# Altium footprint library ARCOM_Chips.PcbLib: 185 footprints (part 5 of 12)
Each footprint in its own frame and in the unit in brackets; x right, y up, seen from the top. Pads: shape width x height; smd on the part's side, far side on the other; paste and mask are expansions set on the pad; w line width, h text height; cw(c..) or ccw(c..) is an arc to the next point about the centre after c.
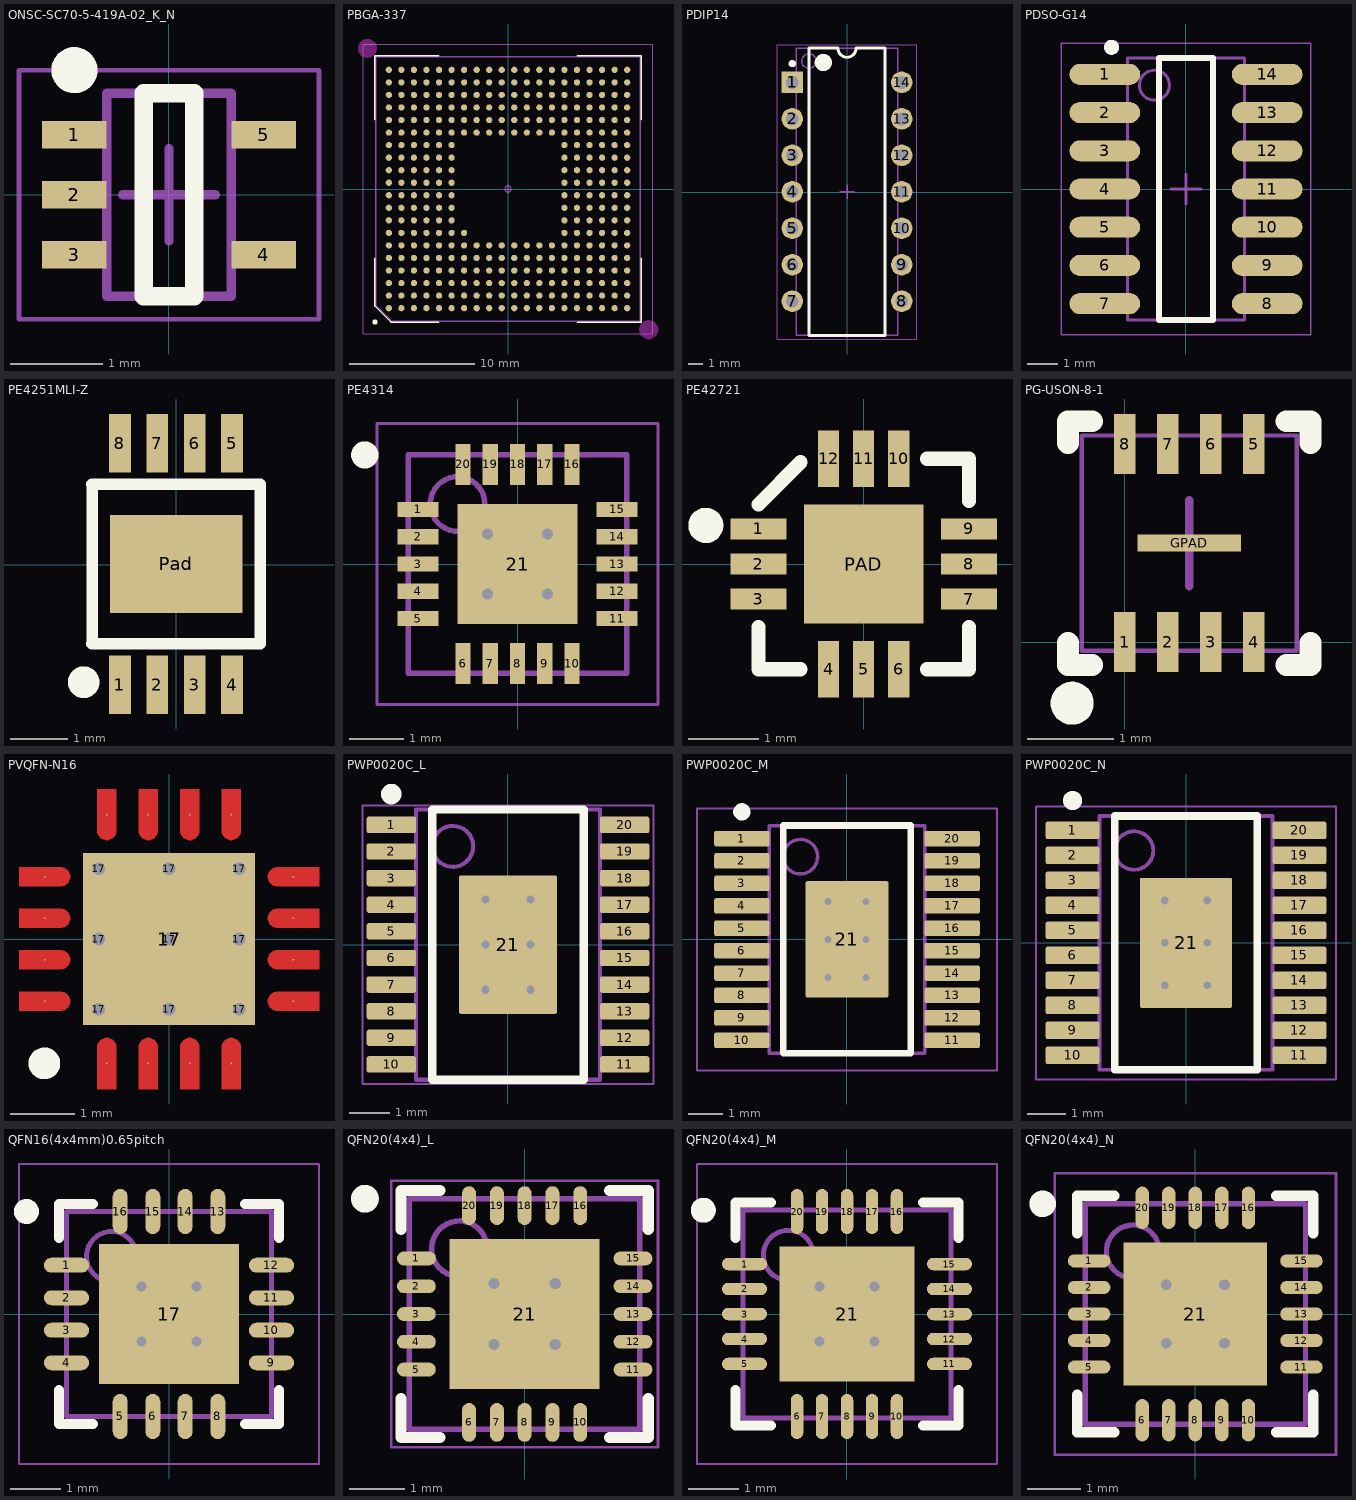
[diagram p4: the footprints below, top view; thin cyan lines are the x and y axes]

## ONSC-SC70-5-419A-02_K_N [mm] "SOT23, 5-Leads, Body 2.2x1.35mm, Pitch 0.65mm, IPC Medium Density"
height 1.1
pads (5):
  rect 0.7x0.3 smd: 1(-1.025,0.65) 2(-1.025,0) 3(-1.025,-0.65) 4(1.025,-0.65) 5(1.025,0.65)
Top Overlay:
  circle w0.25: c-1.025,1.35 r0.125
  lines w0.2: -0.275,-1.1 0.275,-1.1 0.275,1.1 -0.275,1.1 -0.275,-1.1
Mechanical 13:
  lines w0.1: -0.675,-1.1 -0.675,1.1 0.675,1.1 0.675,-1.1 -0.675,-1.1
M15 Top Assy:
  lines w0.05: -1.625,-1.35 -1.625,1.35 1.625,1.35 1.625,-1.35 -1.625,-1.35
  lines w0.1: -0.5,0 0.5,0 ; 0,-0.5 0,0.5
3D body: height 1.1, standoff 0, extent -0.675,-1.1 0.675,1.1

## PBGA-337 [mm]
height 2
pads (337):
  round 0.5 smd: A1(-9.5,-9.5) A2(-9.5,-8.5) A3(-9.5,-7.5) A4(-9.5,-6.5) A5(-9.5,-5.5) A6(-9.5,-4.5) A7(-9.5,-3.5) A8(-9.5,-2.5) A9(-9.5,-1.5) A10(-9.5,-0.5) A11(-9.5,0.5) A12(-9.5,1.5) A13(-9.5,2.5) A14(-9.5,3.5) A15(-9.5,4.5) A16(-9.5,5.5) A17(-9.5,6.5) A18(-9.5,7.5) A19(-9.5,8.5) A20(-9.5,9.5) B1(-8.5,-9.5) B2(-8.5,-8.5) B3(-8.5,-7.5) B4(-8.5,-6.5) B5(-8.5,-5.5) B6(-8.5,-4.5) B7(-8.5,-3.5) B8(-8.5,-2.5) B9(-8.5,-1.5) B10(-8.5,-0.5) B11(-8.5,0.5) B12(-8.5,1.5) B13(-8.5,2.5) B14(-8.5,3.5) B15(-8.5,4.5) B16(-8.5,5.5) B17(-8.5,6.5) B18(-8.5,7.5) B19(-8.5,8.5) B20(-8.5,9.5) C1(-7.5,-9.5) C2(-7.5,-8.5) C3(-7.5,-7.5) C4(-7.5,-6.5) C5(-7.5,-5.5) C6(-7.5,-4.5) C7(-7.5,-3.5) C8(-7.5,-2.5) C9(-7.5,-1.5) C10(-7.5,-0.5) C11(-7.5,0.5) C12(-7.5,1.5) C13(-7.5,2.5) C14(-7.5,3.5) C15(-7.5,4.5) C16(-7.5,5.5) C17(-7.5,6.5) C18(-7.5,7.5) C19(-7.5,8.5) C20(-7.5,9.5) D1(-6.5,-9.5) D2(-6.5,-8.5) D3(-6.5,-7.5) D4(-6.5,-6.5) D5(-6.5,-5.5) D6(-6.5,-4.5) D7(-6.5,-3.5) D8(-6.5,-2.5) D9(-6.5,-1.5) D10(-6.5,-0.5) D11(-6.5,0.5) D12(-6.5,1.5) D13(-6.5,2.5) D14(-6.5,3.5) D15(-6.5,4.5) D16(-6.5,5.5) D17(-6.5,6.5) D18(-6.5,7.5) D19(-6.5,8.5) D20(-6.5,9.5) E1(-5.5,-9.5) E2(-5.5,-8.5) E3(-5.5,-7.5) E4(-5.5,-6.5) E5(-5.5,-5.5) E6(-5.5,-4.5) E7(-5.5,-3.5) E8(-5.5,-2.5) E9(-5.5,-1.5) E10(-5.5,-0.5) E11(-5.5,0.5) E12(-5.5,1.5) E13(-5.5,2.5) E14(-5.5,3.5) E15(-5.5,4.5) E16(-5.5,5.5) E17(-5.5,6.5) E18(-5.5,7.5) E19(-5.5,8.5) E20(-5.5,9.5) F1(-4.5,-9.5) F2(-4.5,-8.5) F3(-4.5,-7.5) F4(-4.5,-6.5) F5(-4.5,-5.5) F6(-4.5,-4.5) F7(-4.5,-3.5) F8(-4.5,-2.5) F9(-4.5,-1.5) F10(-4.5,-0.5) F11(-4.5,0.5) F12(-4.5,1.5) F13(-4.5,2.5) F14(-4.5,3.5) F15(-4.5,4.5) F16(-4.5,5.5) F17(-4.5,6.5) F18(-4.5,7.5) F19(-4.5,8.5) F20(-4.5,9.5) G1(-3.5,-9.5) G2(-3.5,-8.5) G3(-3.5,-7.5) G4(-3.5,-6.5) G5(-3.5,-5.5) G6(-3.5,-4.5) G7(-3.5,-3.5) G15(-3.5,4.5) G16(-3.5,5.5) G17(-3.5,6.5) G18(-3.5,7.5) G19(-3.5,8.5) G20(-3.5,9.5) H1(-2.5,-9.5) H2(-2.5,-8.5) H3(-2.5,-7.5) H4(-2.5,-6.5) H5(-2.5,-5.5) H6(-2.5,-4.5) H15(-2.5,4.5) H16(-2.5,5.5) H17(-2.5,6.5) H18(-2.5,7.5) H19(-2.5,8.5) H20(-2.5,9.5) J1(-1.5,-9.5) J2(-1.5,-8.5) J3(-1.5,-7.5) J4(-1.5,-6.5) J5(-1.5,-5.5) J6(-1.5,-4.5) J15(-1.5,4.5) J16(-1.5,5.5) J17(-1.5,6.5) J18(-1.5,7.5) J19(-1.5,8.5) J20(-1.5,9.5) K1(-0.5,-9.5) K2(-0.5,-8.5) K3(-0.5,-7.5) K4(-0.5,-6.5) K5(-0.5,-5.5) K6(-0.5,-4.5) K15(-0.5,4.5) K16(-0.5,5.5) K17(-0.5,6.5) K18(-0.5,7.5) K19(-0.5,8.5) K20(-0.5,9.5) L1(0.5,-9.5) L2(0.5,-8.5) L3(0.5,-7.5) L4(0.5,-6.5) L5(0.5,-5.5) L6(0.5,-4.5) L15(0.5,4.5) L16(0.5,5.5) L17(0.5,6.5) L18(0.5,7.5) L19(0.5,8.5) L20(0.5,9.5) M1(1.5,-9.5) M2(1.5,-8.5) M3(1.5,-7.5) M4(1.5,-6.5) M5(1.5,-5.5) M6(1.5,-4.5) M15(1.5,4.5) M16(1.5,5.5) M17(1.5,6.5) M18(1.5,7.5) M19(1.5,8.5) M20(1.5,9.5) N1(2.5,-9.5) N2(2.5,-8.5) N3(2.5,-7.5) N4(2.5,-6.5) N5(2.5,-5.5) N6(2.5,-4.5) N15(2.5,4.5) N16(2.5,5.5) N17(2.5,6.5) N18(2.5,7.5) N19(2.5,8.5) N20(2.5,9.5) P1(3.5,-9.5) P2(3.5,-8.5) P3(3.5,-7.5) P4(3.5,-6.5) P5(3.5,-5.5) P6(3.5,-4.5) P15(3.5,4.5) P16(3.5,5.5) P17(3.5,6.5) P18(3.5,7.5) P19(3.5,8.5) P20(3.5,9.5) R1(4.5,-9.5) R2(4.5,-8.5) R3(4.5,-7.5) R4(4.5,-6.5) R5(4.5,-5.5) R6(4.5,-4.5) R7(4.5,-3.5) R8(4.5,-2.5) R9(4.5,-1.5) R10(4.5,-0.5) R11(4.5,0.5) R12(4.5,1.5) R13(4.5,2.5) R14(4.5,3.5) R15(4.5,4.5) R16(4.5,5.5) R17(4.5,6.5) R18(4.5,7.5) R19(4.5,8.5) R20(4.5,9.5) T1(5.5,-9.5) T2(5.5,-8.5) T3(5.5,-7.5) T4(5.5,-6.5) T5(5.5,-5.5) T6(5.5,-4.5) T7(5.5,-3.5) T8(5.5,-2.5) T9(5.5,-1.5) T10(5.5,-0.5) T11(5.5,0.5) T12(5.5,1.5) T13(5.5,2.5) T14(5.5,3.5) T15(5.5,4.5) T16(5.5,5.5) T17(5.5,6.5) T18(5.5,7.5) T19(5.5,8.5) T20(5.5,9.5) U1(6.5,-9.5) U2(6.5,-8.5) U3(6.5,-7.5) U4(6.5,-6.5) U5(6.5,-5.5) U6(6.5,-4.5) U7(6.5,-3.5) U8(6.5,-2.5) U9(6.5,-1.5) U10(6.5,-0.5) U11(6.5,0.5) U12(6.5,1.5) U13(6.5,2.5) U14(6.5,3.5) U15(6.5,4.5) U16(6.5,5.5) U17(6.5,6.5) U18(6.5,7.5) U19(6.5,8.5) U20(6.5,9.5) V1(7.5,-9.5) V2(7.5,-8.5) V3(7.5,-7.5) V4(7.5,-6.5) V5(7.5,-5.5) V6(7.5,-4.5) V7(7.5,-3.5) V8(7.5,-2.5) V9(7.5,-1.5) V10(7.5,-0.5) V11(7.5,0.5) V12(7.5,1.5) V13(7.5,2.5) V14(7.5,3.5) V15(7.5,4.5) V16(7.5,5.5) V17(7.5,6.5) V18(7.5,7.5) V19(7.5,8.5) V20(7.5,9.5) W1(8.5,-9.5) W2(8.5,-8.5) W3(8.5,-7.5) W4(8.5,-6.5) W5(8.5,-5.5) W6(8.5,-4.5) W7(8.5,-3.5) W8(8.5,-2.5) W9(8.5,-1.5) W10(8.5,-0.5) W11(8.5,0.5) W12(8.5,1.5) W13(8.5,2.5) W14(8.5,3.5) W15(8.5,4.5) W16(8.5,5.5) W17(8.5,6.5) W18(8.5,7.5) W19(8.5,8.5) W20(8.5,9.5) Y1(9.5,-9.5) Y2(9.5,-8.5) Y3(9.5,-7.5) Y4(9.5,-6.5) Y5(9.5,-5.5) Y6(9.5,-4.5) Y7(9.5,-3.5) Y8(9.5,-2.5) Y9(9.5,-1.5) Y10(9.5,-0.5) Y11(9.5,0.5) Y12(9.5,1.5) Y13(9.5,2.5) Y14(9.5,3.5) Y15(9.5,4.5) Y16(9.5,5.5) Y17(9.5,6.5) Y18(9.5,7.5) Y19(9.5,8.5) Y20(9.5,9.5)
Top Layer keep-out:
  region: 11.96,-11.21 11.96,-11.136 11.931,-10.991 11.875,-10.855 11.793,-10.732 11.688,-10.627 11.565,-10.545 11.429,-10.489 11.284,-10.46 11.21,-10.46 11.136,-10.46 10.991,-10.489 10.855,-10.545 10.732,-10.627 10.627,-10.732 10.545,-10.855 10.489,-10.991 10.46,-11.136 10.46,-11.21 10.46,-11.284 10.489,-11.429 10.545,-11.565 10.627,-11.688 10.732,-11.793 10.855,-11.875 10.991,-11.931 11.136,-11.96 11.21,-11.96 11.284,-11.96 11.429,-11.931 11.565,-11.875 11.688,-11.793 11.793,-11.688 11.875,-11.565 11.931,-11.429 11.96,-11.284
  region: -10.46,11.21 -10.46,11.284 -10.489,11.429 -10.545,11.565 -10.627,11.688 -10.732,11.793 -10.855,11.875 -10.991,11.931 -11.136,11.96 -11.21,11.96 -11.284,11.96 -11.429,11.931 -11.565,11.875 -11.688,11.793 -11.793,11.688 -11.875,11.565 -11.931,11.429 -11.96,11.284 -11.96,11.21 -11.96,11.136 -11.931,10.991 -11.875,10.855 -11.793,10.732 -11.688,10.627 -11.565,10.545 -11.429,10.489 -11.284,10.46 -11.21,10.46 -11.136,10.46 -10.991,10.489 -10.855,10.545 -10.732,10.627 -10.627,10.732 -10.545,10.855 -10.489,10.991 -10.46,11.136
Top Overlay:
  circle w0.2: c-10.61,-10.61 r0.1
  lines w0.12: -10.61,-5.53 -10.61,-9.34 -9.34,-10.61 -5.53,-10.61 ; -10.61,5.53 -10.61,10.61 -5.53,10.61 ; 5.53,-10.61 10.61,-10.61 10.61,-5.53 ; 5.53,10.61 10.61,10.61 10.61,5.53
M15 Top Assy:
  lines w0.12: -10.55,-9.28 -9.28,-10.55 10.55,-10.55 10.55,10.55 -10.55,10.55 -10.55,-9.28
Mechanical 20:
  circle w0.05: c0,0 r0.25
  lines w0.05: -0.35,0 0.35,0 ; 0,-0.35 0,0.35 ; -11.55,-11.55 -11.55,11.55 11.55,11.55 11.55,-11.55 -11.55,-11.55

## PDIP14 [mm]
pads (14):
  rect 1.5x1.5 hole 0.9: 1(-3.81,7.645)
  round 1.5 hole 0.9: 2(-3.81,5.105) 3(-3.81,2.565) 4(-3.81,0.025) 5(-3.81,-2.515) 6(-3.81,-5.055) 7(-3.81,-7.595) 8(3.81,-7.595) 9(3.81,-5.055) 10(3.81,-2.515) 11(3.81,0.025) 12(3.81,2.565) 13(3.81,5.105) 14(3.81,7.645)
Top Overlay:
  circle w0.25: c-3.81,8.945 r0.125
  circle w0.6: c-1.65,9.025 r0.3
  lines w0.2: -2.65,-9.975 -2.65,10.025 -0.635,10.025 ccw(c0,10.025) 0.635,10.025 2.65,10.025 2.65,-9.975 -2.65,-9.975
Mechanical 13:
  circle w0.1: c-2.65,9.125 r0.5
  lines w0.1: -3.55,-9.975 -3.55,10.025 3.55,10.025 3.55,-9.975 -3.55,-9.975
M15 Top Assy:
  lines w0.05: -4.85,-10.225 -4.85,10.275 4.85,10.275 4.85,-10.225 -4.85,-10.225
  lines w0.1: -0.5,0.025 0.5,0.025 ; 0,-0.475 0,0.525
3D body: height 5.1, standoff 0.51, extent -3.55,-9.975 3.55,10.025

## PDSO-G14 [mm]
pads (14):
  oval 2.35x0.7 smd: 1(-2.7,3.81) 2(-2.7,2.54) 3(-2.7,1.27) 4(-2.7,0) 5(-2.7,-1.27) 6(-2.7,-2.54) 7(-2.7,-3.81) 8(2.7,-3.81) 9(2.7,-2.54) 10(2.7,-1.27) 11(2.7,0) 12(2.7,1.27) 13(2.7,2.54) 14(2.7,3.81)
Top Overlay:
  circle w0.25: c-2.475,4.71 r0.125
  lines w0.2: -0.9,-4.35 0.9,-4.35 0.9,4.35 -0.9,4.35 -0.9,-4.35
Mechanical 13:
  circle w0.1: c-1.05,3.45 r0.5
  lines w0.1: -1.95,-4.35 1.95,-4.35 1.95,4.35 -1.95,4.35 -1.95,-4.35
M15 Top Assy:
  lines w0.05: -4.15,-4.85 4.15,-4.85 4.15,4.85 -4.15,4.85 -4.15,-4.85
  lines w0.1: -0.5,0 0.5,0 ; 0,-0.5 0,0.5
3D body: height 1.75, standoff 0.1, extent -1.95,-4.35 1.95,4.35

## PE4251MLI-Z [mil]
pads (9):
  rect 15x40 smd: 1(-38.7,-82.02) 2(-13.1,-82.02) 3(12.5,-82.02) 4(38.1,-82.02) 5(38.1,82.98) 6(12.5,82.98) 7(-13.1,82.98) 8(-38.7,82.98)
  rect 90.55x66.93 smd: Pad(-0.2,0.5)
Top Overlay:
  circle w11.81: c-63.36,-80.28 r4.92
  lines w7.87: -57.7,-53.87 57.3,-53.87 57.28,54.83 -57.7,54.83 -57.68,-53.83

## PE4314 [mm] "QFN, 20-Leads, Body 4,00x4,00mm, Pitch 0,50mm, Thermal Pad 2,20x2,20mm, IPC Medium Density"
height 0.9
pads (21):
  rect 0.75x0.28 smd mask+0.057: 1(-1.825,1) 2(-1.825,0.5) 3(-1.825,0) 4(-1.825,-0.5) 5(-1.825,-1) 11(1.825,-1) 12(1.825,-0.5) 13(1.825,0) 14(1.825,0.5) 15(1.825,1)
  rect 0.28x0.75 smd mask+0.057: 6(-1,-1.825) 7(-0.5,-1.825) 8(0,-1.825) 9(0.5,-1.825) 10(1,-1.825) 16(1,1.825) 17(0.5,1.825) 18(0,1.825) 19(-0.5,1.825) 20(-1,1.825)
  rect 2.2x2.2 smd mask+0.057: 21(0,0)
via -0.55,0.55 diameter 0.5 hole 0.2
via 0.55,0.55 diameter 0.5 hole 0.2
via -0.55,-0.55 diameter 0.5 hole 0.2
via 0.55,-0.55 diameter 0.5 hole 0.2
Top Overlay:
  circle w0.25: c-2.8,2 r0.125
Mechanical 13:
  circle w0.1: c-1.1,1.1 r0.5
  lines w0.1: -2,-2 -2,2 2,2 2,-2 -2,-2
M15 Top Assy:
  lines w0.05: -2.575,-2.575 -2.575,2.575 2.575,2.575 2.575,-2.575 -2.575,-2.575
  lines w0.1: -0.5,0 0.5,0 ; 0,-0.5 0,0.5
3D body "PE4314.step": height 0.9, standoff 0, extent -2.05,-2.05 2.05,2.05

## PE42721 [mm]
pads (13):
  rect 0.8x0.3 smd: 1(-1.5,0.5) 2(-1.5,0) 3(-1.5,-0.5) 7(1.5,-0.5) 8(1.5,0) 9(1.5,0.5)
  rect 0.3x0.8 smd: 4(-0.5,-1.5) 5(0,-1.5) 6(0.5,-1.5) 10(0.5,1.5) 11(0,1.5) 12(-0.5,1.5)
  rect 1.7x1.7 smd: PAD(0,0)
Top Overlay:
  circle w0.25: c-2.25,0.55 r0.125
  lines w0.2: -1.5,-0.9 -1.5,-1.5 -0.9,-1.5 ; -1.5,0.85 -0.9,1.45 ; 0.9,-1.5 1.5,-1.5 1.5,-0.9 ; 0.9,1.5 1.5,1.5 1.5,0.9
3D body "User Library-qfn12p300x300ll055ls050h075.SLDPRT": height 0.75, standoff 0, extent -1.499,-1.499 1.501,1.501

## PG-USON-8-1 [mm]
pads (9):
  rect 0.25x0.7 smd: 1(0,0) 2(0.5,0) 3(1,0) 4(1.5,0) 5(1.5,2.3) 6(1,2.3) 7(0.5,2.3) 8(0,2.3)
  rect 1.2x0.2 smd: GPAD(0.75,1.15)
Top Overlay:
  circle w0.25: c-0.61,-0.711 r0.125
  lines w0.254: -0.66,-0.011 -0.66,-0.265 -0.381,-0.265 ; -0.66,2.311 -0.66,2.565 -0.381,2.565 ; 1.881,-0.265 2.16,-0.265 2.16,-0.011 ; 1.881,2.565 2.16,2.565 2.16,2.311
M15 Top Assy:
  lines w0.05: -0.5,-0.1 2,-0.1 2,2.4 -0.5,2.4 -0.5,-0.1
  lines w0.1: 0.25,1.15 1.25,1.15 ; 0.75,0.65 0.75,1.65
3D body: height 0.6, standoff 0, extent -0.5,-0.1 2.007,2.4

## PVQFN-N16 [mm]
pads (26):
  round 0.025 smd: 1(-0.975,-1.95) 2(-0.325,-1.95) 3(0.325,-1.95) 4(0.975,-1.95) 5(1.95,-0.975) 6(1.95,-0.325) 7(1.95,0.325) 8(1.95,0.975) 9(0.975,1.95) 10(0.325,1.95) 11(-0.325,1.95) 12(-0.975,1.95) 13(-1.95,0.975) 14(-1.95,0.325) 15(-1.95,-0.325) 16(-1.95,-0.975)
  round 0.254 hole 0.2: 17(-1.1,-1.1) 17(-1.1,0) 17(-1.1,1.1) 17(0,-1.1) 17(0,0) 17(0,1.1) 17(1.1,-1.1) 17(1.1,0) 17(1.1,1.1)
  rect 2.7x2.7 smd: 17(0,0)
Top Layer:
  region: -0.175,-2.35 -0.175,-1.7 -0.175,-1.68 -0.185,-1.642 -0.205,-1.608 -0.233,-1.58 -0.267,-1.56 -0.305,-1.55 -0.345,-1.55 -0.383,-1.56 -0.417,-1.58 -0.445,-1.608 -0.465,-1.642 -0.475,-1.68 -0.475,-1.7 -0.475,-2.35
  region: 0.475,-2.35 0.475,-1.7 0.475,-1.68 0.465,-1.642 0.445,-1.608 0.417,-1.58 0.383,-1.56 0.345,-1.55 0.305,-1.55 0.267,-1.56 0.233,-1.58 0.205,-1.608 0.185,-1.642 0.175,-1.68 0.175,-1.7 0.175,-2.35
  region: 1.125,-2.35 1.125,-1.7 1.125,-1.68 1.115,-1.642 1.095,-1.608 1.067,-1.58 1.033,-1.56 0.995,-1.55 0.955,-1.55 0.917,-1.56 0.883,-1.58 0.855,-1.608 0.835,-1.642 0.825,-1.68 0.825,-1.7 0.825,-2.35
  region: -1.125,-2.35 -1.125,-1.7 -1.125,-1.68 -1.115,-1.642 -1.095,-1.608 -1.067,-1.58 -1.033,-1.56 -0.995,-1.55 -0.955,-1.55 -0.917,-1.56 -0.883,-1.58 -0.855,-1.608 -0.835,-1.642 -0.825,-1.68 -0.825,-1.7 -0.825,-2.35
  region: 0.175,2.35 0.175,1.7 0.175,1.68 0.185,1.642 0.205,1.608 0.233,1.58 0.267,1.56 0.305,1.55 0.345,1.55 0.383,1.56 0.417,1.58 0.445,1.608 0.465,1.642 0.475,1.68 0.475,1.7 0.475,2.35
  region: -0.475,2.35 -0.475,1.7 -0.475,1.68 -0.465,1.642 -0.445,1.608 -0.417,1.58 -0.383,1.56 -0.345,1.55 -0.305,1.55 -0.267,1.56 -0.233,1.58 -0.205,1.608 -0.185,1.642 -0.175,1.68 -0.175,1.7 -0.175,2.35
  region: -1.125,2.35 -1.125,1.7 -1.125,1.68 -1.115,1.642 -1.095,1.608 -1.067,1.58 -1.033,1.56 -0.995,1.55 -0.955,1.55 -0.917,1.56 -0.883,1.58 -0.855,1.608 -0.835,1.642 -0.825,1.68 -0.825,1.7 -0.825,2.35
  region: 1.125,2.35 1.125,1.7 1.125,1.68 1.115,1.642 1.095,1.608 1.067,1.58 1.033,1.56 0.995,1.55 0.955,1.55 0.917,1.56 0.883,1.58 0.855,1.608 0.835,1.642 0.825,1.68 0.825,1.7 0.825,2.35
  region: 2.35,-0.175 1.7,-0.175 1.68,-0.175 1.642,-0.185 1.608,-0.205 1.58,-0.233 1.56,-0.267 1.55,-0.305 1.55,-0.345 1.56,-0.383 1.58,-0.417 1.608,-0.445 1.642,-0.465 1.68,-0.475 1.7,-0.475 2.35,-0.475
  region: 2.35,0.475 1.7,0.475 1.68,0.475 1.642,0.465 1.608,0.445 1.58,0.417 1.56,0.383 1.55,0.345 1.55,0.305 1.56,0.267 1.58,0.233 1.608,0.205 1.642,0.185 1.68,0.175 1.7,0.175 2.35,0.175
  region: 2.35,1.125 1.7,1.125 1.68,1.125 1.642,1.115 1.608,1.095 1.58,1.067 1.56,1.033 1.55,0.995 1.55,0.955 1.56,0.917 1.58,0.883 1.608,0.855 1.642,0.835 1.68,0.825 1.7,0.825 2.35,0.825
  region: 2.35,-1.125 1.7,-1.125 1.68,-1.125 1.642,-1.115 1.608,-1.095 1.58,-1.067 1.56,-1.033 1.55,-0.995 1.55,-0.955 1.56,-0.917 1.58,-0.883 1.608,-0.855 1.642,-0.835 1.68,-0.825 1.7,-0.825 2.35,-0.825
  region: -2.35,0.175 -1.7,0.175 -1.68,0.175 -1.642,0.185 -1.608,0.205 -1.58,0.233 -1.56,0.267 -1.55,0.305 -1.55,0.345 -1.56,0.383 -1.58,0.417 -1.608,0.445 -1.642,0.465 -1.68,0.475 -1.7,0.475 -2.35,0.475
  region: -2.35,-0.475 -1.7,-0.475 -1.68,-0.475 -1.642,-0.465 -1.608,-0.445 -1.58,-0.417 -1.56,-0.383 -1.55,-0.345 -1.55,-0.305 -1.56,-0.267 -1.58,-0.233 -1.608,-0.205 -1.642,-0.185 -1.68,-0.175 -1.7,-0.175 -2.35,-0.175
  region: -2.35,-1.125 -1.7,-1.125 -1.68,-1.125 -1.642,-1.115 -1.608,-1.095 -1.58,-1.067 -1.56,-1.033 -1.55,-0.995 -1.55,-0.955 -1.56,-0.917 -1.58,-0.883 -1.608,-0.855 -1.642,-0.835 -1.68,-0.825 -1.7,-0.825 -2.35,-0.825
  region: -2.35,1.125 -1.7,1.125 -1.68,1.125 -1.642,1.115 -1.608,1.095 -1.58,1.067 -1.56,1.033 -1.55,0.995 -1.55,0.955 -1.56,0.917 -1.58,0.883 -1.608,0.855 -1.642,0.835 -1.68,0.825 -1.7,0.825 -2.35,0.825
Top Overlay:
  circle w0.254: c-1.953,-1.948 r0.122

## PWP0020C_L [mm] "SOP, 20-Leads, Body 6.6x4.5mm, Pitch 0.65mm, Thermal Pad 3.38x2.4mm, IPC High Density"
height 1.2
pads (21):
  rrect25% 1.2x0.4 smd: 1(-2.85,2.925) 2(-2.85,2.275) 3(-2.85,1.625) 4(-2.85,0.975) 5(-2.85,0.325) 6(-2.85,-0.325) 7(-2.85,-0.975) 8(-2.85,-1.625) 9(-2.85,-2.275) 10(-2.85,-2.925) 11(2.85,-2.925) 12(2.85,-2.275) 13(2.85,-1.625) 14(2.85,-0.975) 15(2.85,-0.325) 16(2.85,0.325) 17(2.85,0.975) 18(2.85,1.625) 19(2.85,2.275) 20(2.85,2.925)
  rrect4% 2.4x3.38 smd: 21(0,0)
via 0.55,-1.1 diameter 0.5 hole 0.2
via -0.55,-1.1 diameter 0.5 hole 0.2
via 0.55,0 diameter 0.5 hole 0.2
via -0.55,0 diameter 0.5 hole 0.2
via 0.55,1.1 diameter 0.5 hole 0.2
via -0.55,1.1 diameter 0.5 hole 0.2
Top Overlay:
  circle w0.25: c-2.85,3.675 r0.125
  lines w0.2: -1.85,-3.3 1.85,-3.3 1.85,3.3 -1.85,3.3 -1.85,-3.3
Mechanical 1:
  text ".Designator" at -1.524,-0.508 h1.02
Mechanical 13:
  circle w0.1: c-1.35,2.4 r0.5
  lines w0.1: -2.25,-3.3 2.25,-3.3 2.25,3.3 -2.25,3.3 -2.25,-3.3
M15 Top Assy:
  lines w0.05: -3.55,-3.4 3.55,-3.4 3.55,3.4 -3.55,3.4 -3.55,-3.4
  lines w0.1: -0.5,0 0.5,0 ; 0,-0.5 0,0.5
3D body "MXA20A_ASM.stp": height 1, standoff 0, extent -3.21,-3.25 3.21,3.25

## PWP0020C_M [mm] "SOP, 20-Leads, Body 6.6x4.5mm, Pitch 0.65mm, Thermal Pad 3.38x2.4mm, IPC Low Density"
height 1.2
pads (21):
  rrect22% 1.6x0.45 smd: 1(-3.05,2.925) 2(-3.05,2.275) 3(-3.05,1.625) 4(-3.05,0.975) 5(-3.05,0.325) 6(-3.05,-0.325) 7(-3.05,-0.975) 8(-3.05,-1.625) 9(-3.05,-2.275) 10(-3.05,-2.925) 11(3.05,-2.925) 12(3.05,-2.275) 13(3.05,-1.625) 14(3.05,-0.975) 15(3.05,-0.325) 16(3.05,0.325) 17(3.05,0.975) 18(3.05,1.625) 19(3.05,2.275) 20(3.05,2.925)
  rrect4% 2.4x3.38 smd: 21(0,0)
via -0.55,1.1 diameter 0.5 hole 0.2
via 0.55,1.1 diameter 0.5 hole 0.2
via -0.55,0 diameter 0.5 hole 0.2
via 0.55,0 diameter 0.5 hole 0.2
via -0.55,-1.1 diameter 0.5 hole 0.2
via 0.55,-1.1 diameter 0.5 hole 0.2
Top Overlay:
  circle w0.25: c-3.05,3.7 r0.125
  lines w0.2: -1.85,-3.3 -1.85,3.3 1.85,3.3 1.85,-3.3 -1.85,-3.3
Mechanical 1:
  text ".Designator" at -1.524,-0.508 h1.02
Mechanical 13:
  circle w0.1: c-1.35,2.4 r0.5
  lines w0.1: -2.25,-3.3 -2.25,3.3 2.25,3.3 2.25,-3.3 -2.25,-3.3
M15 Top Assy:
  lines w0.05: -4.35,-3.8 -4.35,3.8 4.35,3.8 4.35,-3.8 -4.35,-3.8
  lines w0.1: -0.5,0 0.5,0 ; 0,-0.5 0,0.5
3D body "MXA20A_ASM.stp": height 1, standoff 0, extent -3.21,-3.25 3.21,3.25

## PWP0020C_N [mm] "SOP, 20-Leads, Body 6.6x4.5mm, Pitch 0.65mm, Thermal Pad 3.38x2.4mm, IPC Medium Density"
height 1.2
pads (21):
  rrect22% 1.4x0.45 smd: 1(-2.95,2.925) 2(-2.95,2.275) 3(-2.95,1.625) 4(-2.95,0.975) 5(-2.95,0.325) 6(-2.95,-0.325) 7(-2.95,-0.975) 8(-2.95,-1.625) 9(-2.95,-2.275) 10(-2.95,-2.925) 11(2.95,-2.925) 12(2.95,-2.275) 13(2.95,-1.625) 14(2.95,-0.975) 15(2.95,-0.325) 16(2.95,0.325) 17(2.95,0.975) 18(2.95,1.625) 19(2.95,2.275) 20(2.95,2.925)
  rrect4% 2.4x3.38 smd: 21(0,0)
via -0.55,1.1 diameter 0.5 hole 0.2
via 0.55,1.1 diameter 0.5 hole 0.2
via -0.55,0 diameter 0.5 hole 0.2
via 0.55,0 diameter 0.5 hole 0.2
via -0.55,-1.1 diameter 0.5 hole 0.2
via 0.55,-1.1 diameter 0.5 hole 0.2
Top Overlay:
  circle w0.25: c-2.95,3.7 r0.125
  lines w0.2: -1.85,-3.3 -1.85,3.3 1.85,3.3 1.85,-3.3 -1.85,-3.3
Mechanical 1:
  text ".Designator" at -1.524,-0.508 h1.02
Mechanical 13:
  circle w0.1: c-1.35,2.4 r0.5
  lines w0.1: -2.25,-3.3 -2.25,3.3 2.25,3.3 2.25,-3.3 -2.25,-3.3
M15 Top Assy:
  lines w0.05: -3.9,-3.55 -3.9,3.55 3.9,3.55 3.9,-3.55 -3.9,-3.55
  lines w0.1: -0.5,0 0.5,0 ; 0,-0.5 0,0.5
3D body "MXA20A_ASM.stp": height 1, standoff 0, extent -3.21,-3.25 3.21,3.25

## QFN16(4x4mm)0.65pitch [mm]
pads (17):
  oval 0.9x0.3 smd: 1(-2.05,0.975) 2(-2.05,0.325) 3(-2.05,-0.325) 4(-2.05,-0.975) 9(2.05,-0.975) 10(2.05,-0.325) 11(2.05,0.325) 12(2.05,0.975)
  oval 0.3x0.9 smd: 5(-0.975,-2.05) 6(-0.325,-2.05) 7(0.325,-2.05) 8(0.975,-2.05) 13(0.975,2.05) 14(0.325,2.05) 15(-0.325,2.05) 16(-0.975,2.05)
  rect 2.8x2.8 smd: 17(0,0)
via -0.55,0.55 diameter 0.5 hole 0.2
via 0.55,0.55 diameter 0.5 hole 0.2
via -0.55,-0.55 diameter 0.5 hole 0.2
via 0.55,-0.55 diameter 0.5 hole 0.2
Top Overlay:
  circle w0.25: c-2.85,2.05 r0.125
  lines w0.2: -2.2,-1.525 -2.2,-2.2 -1.525,-2.2 ; -2.2,1.525 -2.2,2.2 -1.525,2.2 ; 1.525,-2.2 2.2,-2.2 2.2,-1.525 ; 1.525,2.2 2.2,2.2 2.2,1.525
Mechanical 13:
  circle w0.1: c-1.15,1.15 r0.5
  lines w0.1: -2.05,-2.05 -2.05,2.05 2.05,2.05 2.05,-2.05 -2.05,-2.05
M15 Top Assy:
  lines w0.05: -3,-3 -3,3 3,3 3,-3 -3,-3
  lines w0.1: -0.5,0 0.5,0 ; 0,-0.5 0,0.5
3D body: height 1, standoff 0, extent -2.05,-2.05 2.05,2.05

## QFN20(4x4)_L [mm] "QFN, 20-Leads, Body 4x4mm, Pitch 0.5mm, Thermal Pad 2.7x2.7mm, IPC High Density"
height 1
pads (21):
  oval 0.7x0.25 smd: 1(-1.95,1) 2(-1.95,0.5) 3(-1.95,0) 4(-1.95,-0.5) 5(-1.95,-1) 11(1.95,-1) 12(1.95,-0.5) 13(1.95,0) 14(1.95,0.5) 15(1.95,1)
  oval 0.25x0.7 smd: 6(-1,-1.95) 7(-0.5,-1.95) 8(0,-1.95) 9(0.5,-1.95) 10(1,-1.95) 16(1,1.95) 17(0.5,1.95) 18(0,1.95) 19(-0.5,1.95) 20(-1,1.95)
  rect 2.7x2.7 smd: 21(0,0)
via 0.55,-0.55 diameter 0.5 hole 0.2
via -0.55,-0.55 diameter 0.5 hole 0.2
via 0.55,0.55 diameter 0.5 hole 0.2
via -0.55,0.55 diameter 0.5 hole 0.2
Top Overlay:
  circle w0.25: c-2.875,2.075 r0.125
  lines w0.2: -2.225,-1.525 -2.225,-2.225 -1.525,-2.225 ; -2.225,1.525 -2.225,2.225 -1.525,2.225 ; 1.525,-2.225 2.225,-2.225 2.225,-1.525 ; 1.525,2.225 2.225,2.225 2.225,1.525
Mechanical 13:
  circle w0.1: c-1.175,1.175 r0.5
  lines w0.1: -2.075,-2.075 2.075,-2.075 2.075,2.075 -2.075,2.075 -2.075,-2.075
M15 Top Assy:
  lines w0.05: -2.4,-2.4 2.4,-2.4 2.4,2.4 -2.4,2.4 -2.4,-2.4
  lines w0.1: -0.5,0 0.5,0 ; 0,-0.5 0,0.5
3D body: height 1, standoff 0, extent -2.075,-2.075 2.075,2.075

## QFN20(4x4)_M [mm] "QFN, 20-Leads, Body 4x4mm, Pitch 0.5mm, Thermal Pad 2.7x2.7mm, IPC Low Density"
height 1
pads (21):
  oval 0.9x0.25 smd: 1(-2.05,1) 2(-2.05,0.5) 3(-2.05,0) 4(-2.05,-0.5) 5(-2.05,-1) 11(2.05,-1) 12(2.05,-0.5) 13(2.05,0) 14(2.05,0.5) 15(2.05,1)
  oval 0.25x0.9 smd: 6(-1,-2.05) 7(-0.5,-2.05) 8(0,-2.05) 9(0.5,-2.05) 10(1,-2.05) 16(1,2.05) 17(0.5,2.05) 18(0,2.05) 19(-0.5,2.05) 20(-1,2.05)
  rect 2.7x2.7 smd: 21(0,0)
via 0.55,-0.55 diameter 0.5 hole 0.2
via -0.55,-0.55 diameter 0.5 hole 0.2
via 0.55,0.55 diameter 0.5 hole 0.2
via -0.55,0.55 diameter 0.5 hole 0.2
Top Overlay:
  circle w0.25: c-2.875,2.075 r0.125
  lines w0.2: -2.225,-1.525 -2.225,-2.225 -1.525,-2.225 ; -2.225,1.525 -2.225,2.225 -1.525,2.225 ; 1.525,-2.225 2.225,-2.225 2.225,-1.525 ; 1.525,2.225 2.225,2.225 2.225,1.525
Mechanical 13:
  circle w0.1: c-1.175,1.175 r0.5
  lines w0.1: -2.075,-2.075 2.075,-2.075 2.075,2.075 -2.075,2.075 -2.075,-2.075
M15 Top Assy:
  lines w0.05: -3,-3 3,-3 3,3 -3,3 -3,-3
  lines w0.1: -0.5,0 0.5,0 ; 0,-0.5 0,0.5
3D body: height 1, standoff 0, extent -2.075,-2.075 2.075,2.075

## QFN20(4x4)_N [mm] "QFN, 20-Leads, Body 4x4mm, Pitch 0.5mm, Thermal Pad 2.7x2.7mm, IPC Medium Density"
height 1
pads (21):
  oval 0.8x0.25 smd: 1(-2,1) 2(-2,0.5) 3(-2,0) 4(-2,-0.5) 5(-2,-1) 11(2,-1) 12(2,-0.5) 13(2,0) 14(2,0.5) 15(2,1)
  oval 0.25x0.8 smd: 6(-1,-2) 7(-0.5,-2) 8(0,-2) 9(0.5,-2) 10(1,-2) 16(1,2) 17(0.5,2) 18(0,2) 19(-0.5,2) 20(-1,2)
  rect 2.7x2.7 smd: 21(0,0)
via -0.55,0.55 diameter 0.5 hole 0.2
via 0.55,0.55 diameter 0.5 hole 0.2
via -0.55,-0.55 diameter 0.5 hole 0.2
via 0.55,-0.55 diameter 0.5 hole 0.2
Top Overlay:
  circle w0.25: c-2.875,2.075 r0.125
  lines w0.2: -2.225,-1.525 -2.225,-2.225 -1.525,-2.225 ; -2.225,1.525 -2.225,2.225 -1.525,2.225 ; 1.525,-2.225 2.225,-2.225 2.225,-1.525 ; 1.525,2.225 2.225,2.225 2.225,1.525
Mechanical 13:
  circle w0.1: c-1.175,1.175 r0.5
  lines w0.1: -2.075,-2.075 -2.075,2.075 2.075,2.075 2.075,-2.075 -2.075,-2.075
M15 Top Assy:
  lines w0.05: -2.65,-2.65 -2.65,2.65 2.65,2.65 2.65,-2.65 -2.65,-2.65
  lines w0.1: -0.5,0 0.5,0 ; 0,-0.5 0,0.5
3D body: height 1, standoff 0, extent -2.075,-2.075 2.075,2.075